# Altium footprint library andylib.PcbLib: 158 footprints (part 10 of 10)
Each footprint in its own frame and in the unit in brackets; x right, y up, seen from the top. Pads: shape width x height; smd on the part's side, far side on the other; paste and mask are expansions set on the pad; w line width, h text height; cw(c..) or ccw(c..) is an arc to the next point about the centre after c.
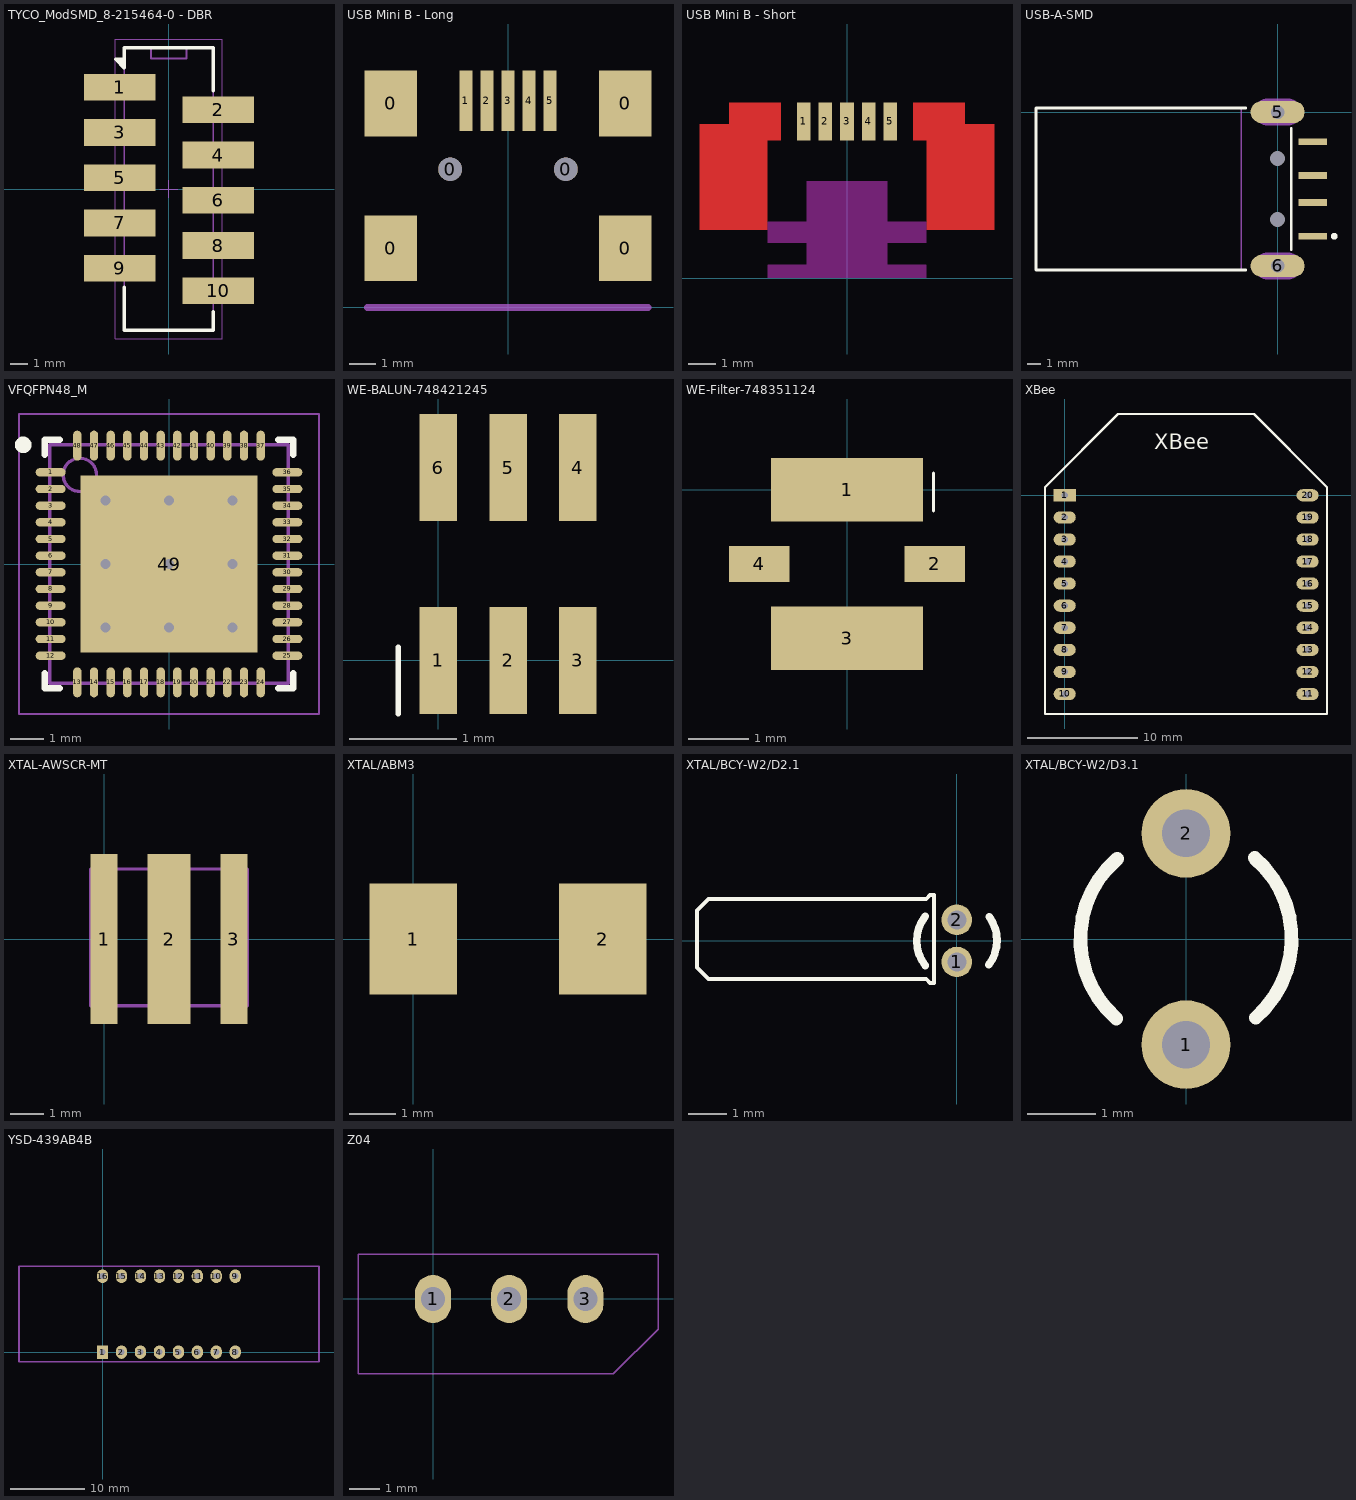
[diagram p9: the footprints below, top view; thin cyan lines are the x and y axes]

## TYCO_ModSMD_8-215464-0 - DBR [mm] "Micro-Match 10 pins Male on board Vertical Truehole Modified in SMDconnector"
height 6.9
pads (10):
  rect 4x1.499 smd: 1(-2.75,5.715) 2(2.775,4.445) 3(-2.75,3.175) 4(2.775,1.905) 5(-2.75,0.635) 6(2.775,-0.635) 7(-2.75,-1.905) 8(2.775,-3.175) 9(-2.75,-4.445) 10(2.775,-5.715)
Top Overlay:
  lines w0.2: -2.785,7.28 -2.757,7.28 -2.5,7.023 ; -2.5,6.995 -2.5,7.281 ; -2.5,7.284 -2.504,7.28 -2.985,7.28 -2.5,6.795 -2.5,7.92 2.5,7.92 2.5,5.525 ; -2.5,-5.525 -2.5,-7.92 2.5,-7.92 2.5,-6.89
Mechanical 13:
  lines w0.1: -2.5,5.415 -2.2,5.715 -2.5,6.015 ; -2.5,5.515 -2.3,5.715 -2.5,5.915 ; -2.5,5.615 -2.4,5.715 -2.5,5.815 ; -1,7.92 -1,7.32 1,7.32 1,7.92 ; -2.5,-7.92 2.5,-7.92 2.5,7.92 -2.5,7.92 -2.5,-7.92
  text ".Designator" at 0.175,0.42 h0.5
Mechanical 15:
  lines w0.05: -3.617,5.715 -3.117,5.715 ; -3.117,5.215 -3.117,5.715 ; -3.117,6.215 -3.117,5.715 ; -2.617,5.715 -3.117,5.715 ; -0.5,0 0,0 ; 0,-0.5 0,0 ; 0,0.5 0,0 ; 0.5,0 0,0 ; -3,-8.42 -3,8.42 3,8.42 3,-8.42 -3,-8.42
3D body: height 3.8, standoff 0, extent -2.5,-7.92 2.5,7.92
3D body: height 6.9, standoff 0, extent -1,7.32 1,7.92

## USB Mini B - Long [mm] "Mini USB Socket B - Long version"
height 3.9
pads (11):
  rect 2x2.5 smd: 0(-4.45,2.25) 0(-4.45,7.75) 0(4.45,2.25) 0(4.45,7.75)
  round 0.9 hole 0.9 unplated paste+0 mask+0: 0(-2.2,5.25) 0(2.2,5.25)
  rect 0.5x2.3 smd: 1(-1.6,7.85) 2(-0.8,7.85) 3(0,7.85) 4(0.8,7.85) 5(1.6,7.85)
Mechanical 13:
  lines w0.254: -5.35,0 0,0 5.325,0
3D body: height 3.95, standoff -1, extent -5.35,-0.625 5.35,8.575

## USB Mini B - Short [mm]
pads (5):
  rect 0.5x1.4 smd: 1(-1.6,5.8) 2(-0.8,5.8) 3(0,5.8) 4(0.8,5.8) 5(1.6,5.8)
Top Layer:
  region: -2.45,6.5 -4.35,6.5 -4.35,5.7 -5.45,5.7 -5.45,1.8 -2.95,1.8 -2.95,5.1 -2.45,5.1
  region: 2.45,6.5 4.35,6.5 4.35,5.7 5.45,5.7 5.45,1.8 2.95,1.8 2.95,5.1 2.45,5.1
Top Layer keep-out:
  rectangle: -1.5,0 1.5,3.6
  rectangle: -2.95,1.3 2.95,2.1
  rectangle: -2.95,0 2.95,0.5
Top Solder:
  region: -2.35,6.6 -4.45,6.6 -4.45,5.8 -5.55,5.8 -5.55,1.7 -2.85,1.7 -2.85,5 -2.35,5
  region: 2.35,6.6 4.45,6.6 4.45,5.8 5.55,5.8 5.55,1.7 2.85,1.7 2.85,5 2.35,5
3D body: height 4.14, standoff -0.95, extent -4.95,-3.1 4.95,6.1

## USB-A-SMD [mm]
pads (8):
  rect 2.1x0.5 smd: 1(2.6,-9.2) 2(2.6,-6.7) 3(2.6,-4.7) 4(2.6,-2.2)
  oval 4x1.65 hole 1: 5(0,0) 6(0,-11.4)
  round 0.8 hole 1.1 unplated: MH1(0,-3.45) MH2(0,-7.95)
Top Overlay:
  circle w0.25: c4.2,-9.2 r0.125
  lines w0.2: -2.37,-11.7 -17.9,-11.7 -17.9,0.3 -2.37,0.3 ; 1,-10.175 1,-1.225
Mechanical 1:
  lines w0.1: -2.7,-11.7 -2.7,0.3
  lines w1: -0.75,-11.4 0.75,-11.4 ; -0.75,0 0.75,0
  text "Mech 2 - Clearance, move to internal plane if present" at -3.259,-12.228 h0.3
  text "Mech 1 - Slot cut-out" at -3.259,-12.863 h0.3
  text "Assign keep-out area to slot" at -3.183,-14.641 h0.3
  text "Slot 1x2.5mm, PTH" at -3.183,-13.422 h0.3
  text "Alert PCB fab to slot details" at -3.259,-13.93 h0.3
  text "PCB Edge" at -3.183,-0.137 h0.25
Mechanical 2:
  lines w2.016: -0.75,-11.4 0.75,-11.4 ; -0.75,0 0.75,0
3D body: height 3.15, standoff -2.65, extent -17.709,-12.018 2.591,0.588

## VFQFPN48_M [mm] "QFN, 48-Leads, Body 7x7mm, Pitch 0.5mm, Thermal Pad 5.3x5.3mm, IPC Low Density"
height 1
pads (49):
  oval 0.9x0.25 smd: 1(-3.55,2.75) 2(-3.55,2.25) 3(-3.55,1.75) 4(-3.55,1.25) 5(-3.55,0.75) 6(-3.55,0.25) 7(-3.55,-0.25) 8(-3.55,-0.75) 9(-3.55,-1.25) 10(-3.55,-1.75) 11(-3.55,-2.25) 12(-3.55,-2.75) 25(3.55,-2.75) 26(3.55,-2.25) 27(3.55,-1.75) 28(3.55,-1.25) 29(3.55,-0.75) 30(3.55,-0.25) 31(3.55,0.25) 32(3.55,0.75) 33(3.55,1.25) 34(3.55,1.75) 35(3.55,2.25) 36(3.55,2.75)
  oval 0.25x0.9 smd: 13(-2.75,-3.55) 14(-2.25,-3.55) 15(-1.75,-3.55) 16(-1.25,-3.55) 17(-0.75,-3.55) 18(-0.25,-3.55) 19(0.25,-3.55) 20(0.75,-3.55) 21(1.25,-3.55) 22(1.75,-3.55) 23(2.25,-3.55) 24(2.75,-3.55) 37(2.75,3.55) 38(2.25,3.55) 39(1.75,3.55) 40(1.25,3.55) 41(0.75,3.55) 42(0.25,3.55) 43(-0.25,3.55) 44(-0.75,3.55) 45(-1.25,3.55) 46(-1.75,3.55) 47(-2.25,3.55) 48(-2.75,3.55)
  rect 5.3x5.3 smd: 49(0,0)
via -1.905,-1.905 diameter 0.6 hole 0.3
via 0,-1.905 diameter 0.6 hole 0.3
via 1.905,-1.905 diameter 0.6 hole 0.3
via 1.905,1.905 diameter 0.6 hole 0.3
via 1.905,0 diameter 0.6 hole 0.3
via 0,0 diameter 0.6 hole 0.3
via -1.905,0 diameter 0.6 hole 0.3
via -1.905,1.905 diameter 0.6 hole 0.3
via 0,1.905 diameter 0.6 hole 0.3
Top Overlay:
  circle w0.25: c-4.375,3.575 r0.125
  lines w0.2: -3.725,-3.275 -3.725,-3.725 -3.275,-3.725 ; -3.725,3.275 -3.725,3.725 -3.275,3.725 ; 3.275,-3.725 3.725,-3.725 3.725,-3.275 ; 3.275,3.725 3.725,3.725 3.725,3.275
Mechanical 13:
  circle w0.1: c-2.675,2.675 r0.5
  lines w0.1: -3.575,-3.575 -3.575,3.575 3.575,3.575 3.575,-3.575 -3.575,-3.575
Mechanical 15:
  lines w0.05: -4.5,-4.5 -4.5,4.5 4.5,4.5 4.5,-4.5 -4.5,-4.5
  lines w0.1: -0.5,0 0.5,0 ; 0,-0.5 0,0.5
3D body: height 1, standoff 0, extent -3.575,-3.575 3.575,3.575
3D body: height 0.78, standoff -0.02, extent -3.51,-3.52 3.51,3.5

## WE-BALUN-748421245 [mm] "2.45Ghz RF Balun 50/100 Ohm"
height 0.85
pads (6):
  rect 0.35x1 smd: 1(0,0) 2(0.65,0) 3(1.3,0) 4(1.3,1.8) 5(0.65,1.8) 6(0,1.8)
Top Overlay:
  lines w0.05: -0.375,-0.5 -0.375,0.125
3D body: height 0.8, standoff 0, extent -0.35,0.275 1.65,1.525

## WE-Filter-748351124 [mm] "2.45Ghz RF Filter"
height 0.85
pads (4):
  rect 2.5x1.05 smd: 1(0,0) 3(0,-2.45)
  rect 1x0.6 smd: 2(1.45,-1.225) 4(-1.45,-1.225)
Top Overlay:
  lines w0.05: 1.425,-0.35 1.425,0.275
3D body: height 0.94, standoff 0, extent -1.27,-2.245 1.27,-0.205

## XBee [mm]
height 15
pads (20):
  rect 2x1.1 hole 0.6: 1(0,0)
  oval 2x1.1 hole 0.6: 2(0,-2) 3(0,-4) 4(0,-6) 5(0,-8) 6(0,-10) 7(0,-12) 8(0,-14) 9(0,-16) 10(0,-18) 11(22,-18) 12(22,-16) 13(22,-14) 14(22,-12) 15(22,-10) 16(22,-8) 17(22,-6) 18(22,-4) 19(22,-2) 20(22,0)
Top Overlay:
  lines w0.2: -1.778,-19.812 -1.778,0.762 4.826,7.366 17.145,7.366 23.749,0.762 23.749,-19.812 -1.778,-19.812
  text "XBee" at 8.128,3.683 h2.4
3D body: height 4, standoff 0, extent -1.4,-19.25 1.45,0.8
3D body: height 4, standoff 0, extent 20.55,-19.25 23.4,0.8
3D body: height -0.6, standoff -8.1, extent -1.25,-20.1 23.25,7.8

## XTAL-AWSCR-MT [mm] "Abracon RES CER 4.7 x 4.1 mm"
height 1.5
pads (3):
  rect 0.8x5.1 smd paste+0 mask+0: 1(0,0) 3(3.9,0)
  rect 1.3x5.1 smd paste+0 mask+0: 2(1.95,0)
Mechanical 13:
  lines w0.1: -0.4,-2 4.3,-2 4.3,2.1 -0.4,2.1 -0.4,-2
3D body: height 1.5, standoff 0, extent -0.4,-2 4.3,2.1

## XTAL/ABM3 [mm] "Crystal, SMD; 2 Leads; Body 5 x 3.2 x 1.3 mm (LxWxH)"
height 1.3
pads (2):
  rect 1.9x2.4 smd: 1(0,0) 2(4.1,0)
3D body: height 1.3, standoff 0, extent -0.4,-1.6 4.6,1.6

## XTAL/BCY-W2/D2.1 [mm] "Crystal, Thru-Hole; 2 Leads; Body 2.1 x 6 mm (Dia.xH)"
height 6
pads (2):
  round 0.8 hole 0.5: 1(0,-0.55) 2(0,0.55)
Top Overlay:
  lines w0.1: -0.6,-1.1 -0.7,-1.1 -0.8,-1 -6.5,-1 -6.8,-0.7 -6.8,0.8 -6.5,1.1 -0.8,1.1 -0.7,1.2 -0.6,1.2 -0.6,-1.1 ; -0.6,-1.1 -0.6,-1.1
  lines w0.2: -0.829,-0.645 cw(c0,0) -0.829,0.645 ; 0.835,-0.627 ccw(c0,0.01) 0.845,0.633

## XTAL/BCY-W2/D3.1 [mm] "Crystal, Thru-Hole; 2 Leads; Body 3.1 x 8.2 mm (Dia.xH)"
height 8.2
pads (2):
  round 1.3 hole 0.7: 1(0,-1.55) 2(0,1.55)
Top Overlay:
  lines w0.2: -1.022,-1.165 cw(c0,0) -1.006,1.179 ; 1.006,1.189 cw(c0,0.01) 1.022,-1.155

## YSD-439AB4B [mm] "4 Digit 7 Segment display"
height 7
pads (16):
  rect 1.5x1.8 hole 0.8 paste+0 mask+0: 1(0,0)
  oval 1.5x1.8 hole 0.8 paste+0 mask+0: 2(2.54,0) 3(5.08,0) 4(7.62,0) 5(10.16,0) 6(12.7,0) 7(15.24,0) 8(17.78,0) 9(17.78,10.16) 10(15.24,10.16) 11(12.7,10.16) 12(10.16,10.16) 13(7.62,10.16) 14(5.08,10.16) 15(2.54,10.16) 16(0,10.16)
Mechanical 13:
  lines w0.254: -11.185,-1.3 -11.185,11.5 28.995,11.5 28.995,-1.3 -11.185,-1.3
3D body: height 7, standoff -3.4, extent -11.2,-1.32 28.98,11.48

## Z04 [mm] "600V 4A Triac"
height 8.8
pads (3):
  oval 1.2x1.6 hole 0.8: 1(0,0) 2(2.54,0) 3(5.08,0)
Mechanical 13:
  lines w0.05: -2.5,-2.5 6,-2.5 7.5,-1 7.5,1.5 -2.5,1.5 -2.5,-2.5